# Altium schematic symbol library SignalCommunications.SCHLIB: 804 symbols (part 4 of 9)
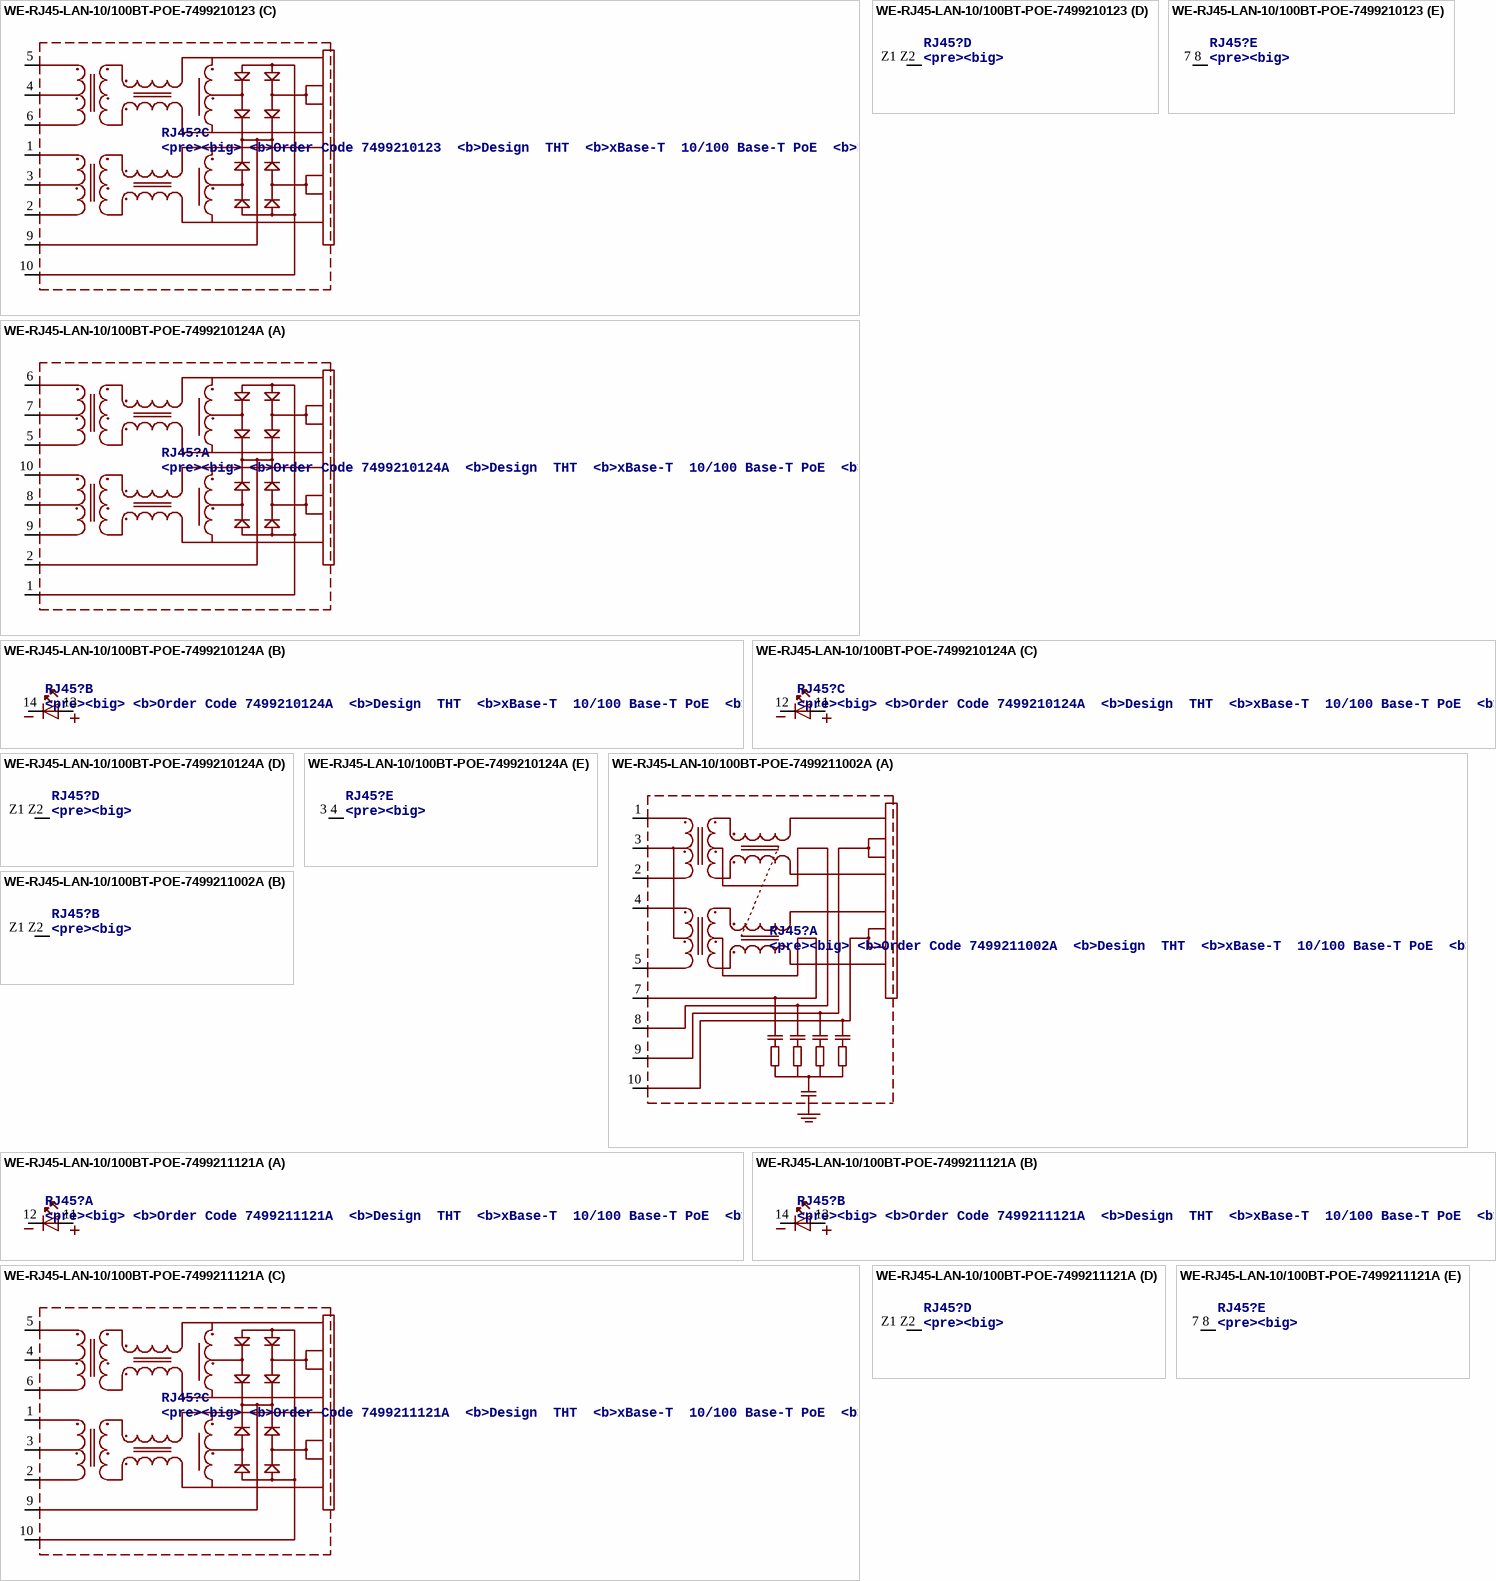
[diagram p45: symbols WE-RJ45-LAN-10/100BT-POE-7499210123 to WE-RJ45-LAN-10/100BT-POE-7499211121A]

## WE-RJ45-LAN-10/100BT-POE-7499210124A
designator RJ45?, comment <pre><big> / <b>Order Code	7499210124A / <b>Design		THT / <b>xBase-T		10/100 Base-T PoE / <b>Ports		1x1 / <b>Application	PoE / <b>Tab Position	UP / <b>LED (Left-Right)	YELLOW-GREEN / <b>EMI Fingers	No
MANUFACTURER: Würth Elektronik eiSos GmbH; CREATED-BY: Christin Zierenner; COMPANY-URL: http://www.we-online.de; CREATED-DATE: AUG 2012; DATASHEET-URL: http://katalog.we-online.de/kataloge/eisos/media/pdf/7499210124A.pdf
footprint 7499210124A
part A pins: 1 VC1- (power), 2 VC1+ (power), 5 RD-, 6 RD+, 7 RCT, 8 TCT, 9 TD-, 10 TD+
part B pins: 13 A, 14 K
part C pins: 11 A, 12 K
part D pins: Z1 Z2 P$1 (power)
part E pins: 3 4 NC

## WE-RJ45-LAN-10/100BT-POE-7499211002A
designator RJ45?, comment <pre><big> / <b>Order Code	7499211002A / <b>Design		THT / <b>xBase-T		10/100 Base-T PoE / <b>Ports		1x1 / <b>Application	PoE / <b>Tab Position	DOWN / <b>LED (Left-Right)	NONE / <b>EMI Fingers	Yes
MANUFACTURER: Würth Elektronik eiSos GmbH; CREATED-BY: Christin Zierenner; COMPANY-URL: http://www.we-online.de; CREATED-DATE: AUG 2012; DATASHEET-URL: http://katalog.we-online.de/kataloge/eisos/media/pdf/7499211002A.pdf
footprint 7499211002A
part A pins: 1 TD+, 2 TD-, 3 TCT, 4 RD+, 5 RD-, 7 VC1+ (power), 8 VC1- (power), 9 VC2+ (power), 10 VC2- (power)
part B pins: Z1 Z2 P$1 (power)

## WE-RJ45-LAN-10/100BT-POE-7499211121A
designator RJ45?, comment <pre><big> / <b>Order Code	7499211121A / <b>Design		THT / <b>xBase-T		10/100 Base-T PoE / <b>Ports		1x1 / <b>Application	PoE / <b>Tab Position	DOWN / <b>LED (Left-Right)	YELLOW-GREEN / <b>EMI Fingers	Yes
MANUFACTURER: Würth Elektronik eiSos GmbH; CREATED-BY: Christin Zierenner; COMPANY-URL: http://www.we-online.de; CREATED-DATE: AUG 2012; DATASHEET-URL: http://katalog.we-online.de/kataloge/eisos/media/pdf/7499211121A.pdf
footprint 7499211121A
part A pins: 11 A, 12 K
part B pins: 13 A, 14 K
part C pins: 1 RD+, 2 RD-, 3 RCT, 4 TCT, 5 TD+, 6 TD-, 9 VC1+ (power), 10 VC1- (power)
part D pins: Z1 Z2 P$1 (power)
part E pins: 7 8 NC

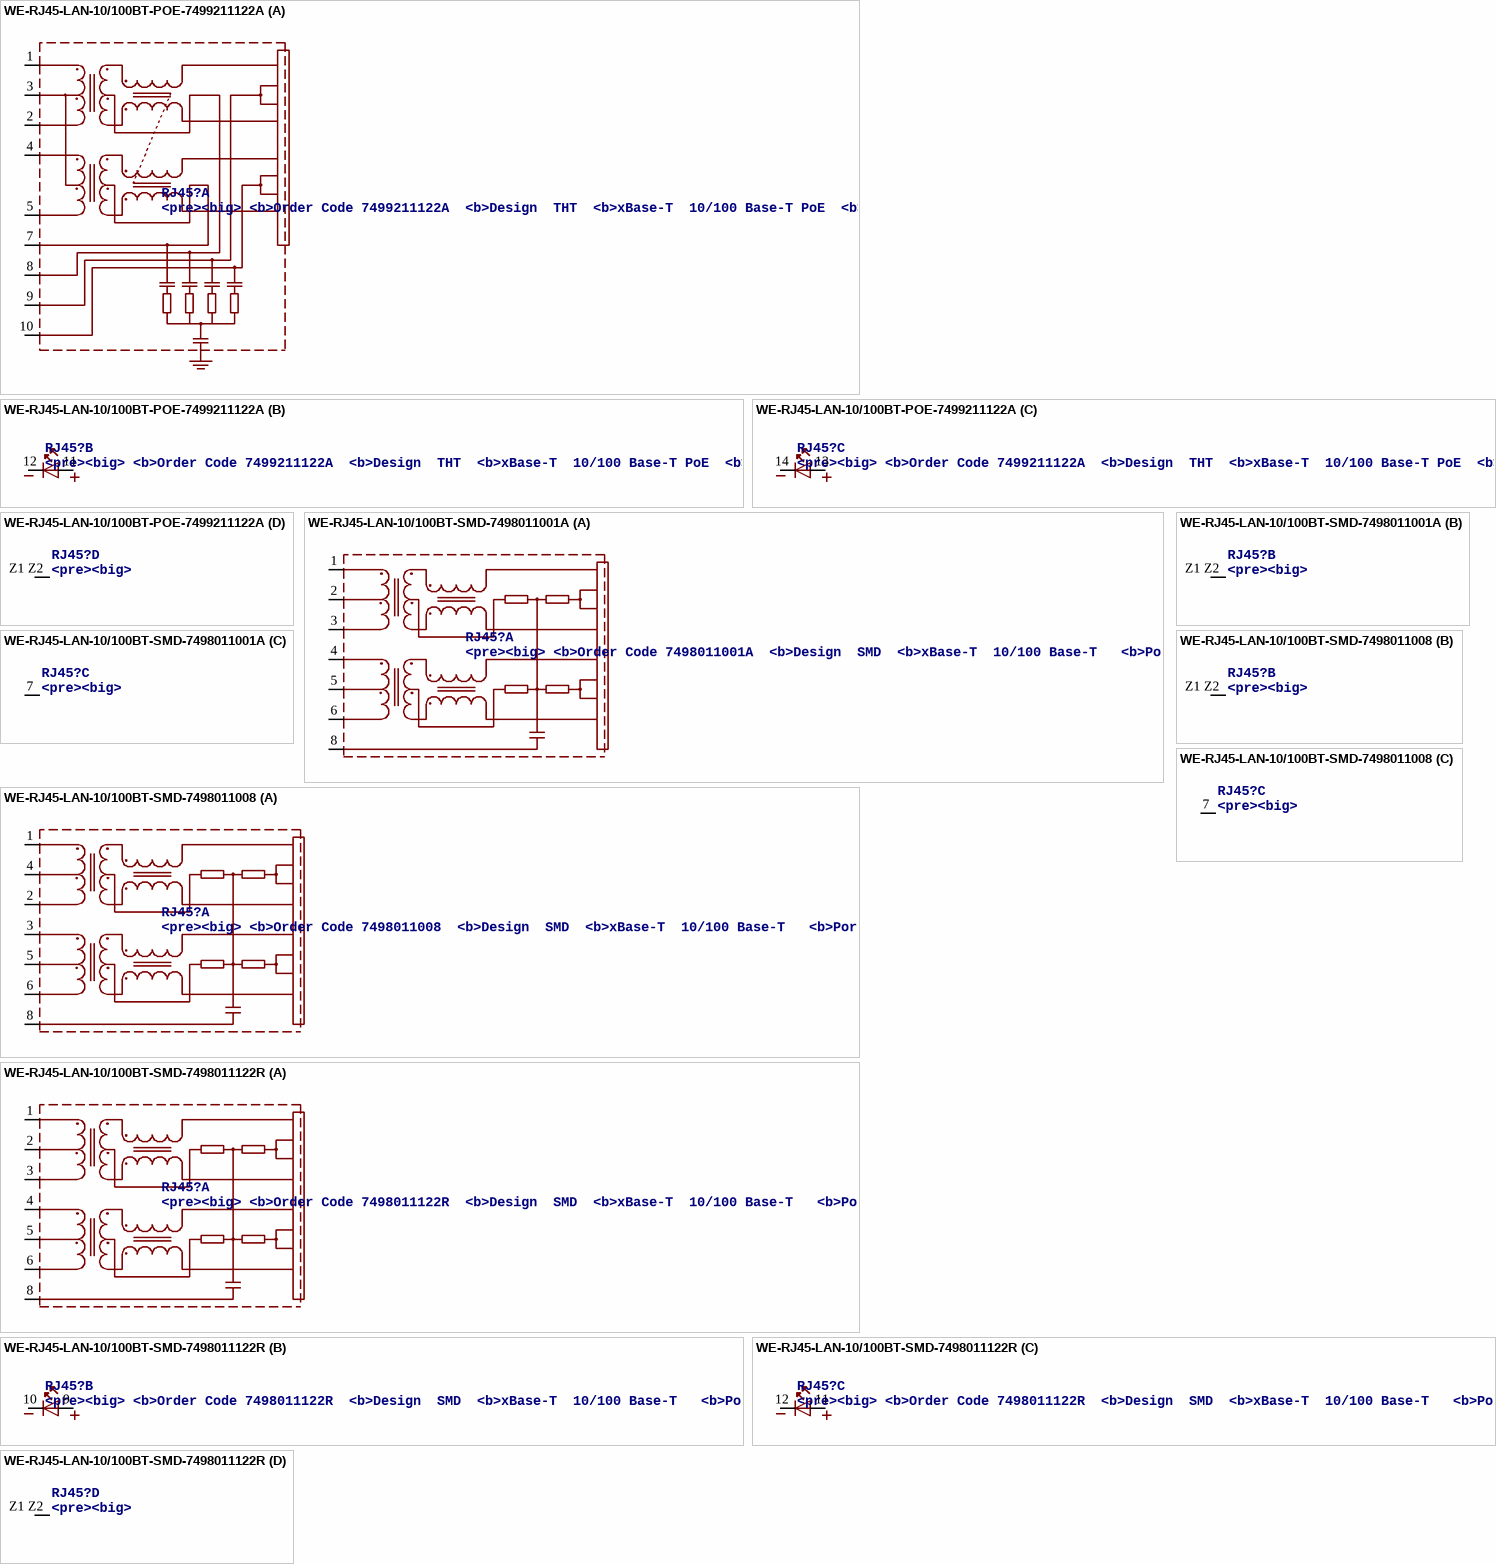
[diagram p26: symbols WE-RJ45-LAN-10/100BT-POE-7499211122A to WE-RJ45-LAN-10/100BT-SMD-7498011122R]

## WE-RJ45-LAN-10/100BT-POE-7499211122A
designator RJ45?, comment <pre><big> / <b>Order Code	7499211122A / <b>Design		THT / <b>xBase-T		10/100 Base-T PoE / <b>Ports		1x1 / <b>Application	PoE / <b>Tab Position	DOWN / <b>LED (Left-Right)	YELLOW-GREEN / <b>EMI Fingers	Yes
MANUFACTURER: Würth Elektronik eiSos GmbH; CREATED-BY: Christin Zierenner; COMPANY-URL: http://www.we-online.de; CREATED-DATE: AUG 2012; DATASHEET-URL: http://katalog.we-online.de/kataloge/eisos/media/pdf/7499211122A.pdf
footprint 7499211122A
part A pins: 1 RD+, 2 RD-, 3 RCT, 4 TD+, 5 TD-, 7 VC1+ (power), 8 VC1- (power), 9 VC2+ (power), 10 VC2- (power)
part B pins: 11 A, 12 K
part C pins: 13 A, 14 K
part D pins: Z1 Z2 P$1 (power)

## WE-RJ45-LAN-10/100BT-SMD-7498011001A
designator RJ45?, comment <pre><big> / <b>Order Code	7498011001A / <b>Design		SMD / <b>xBase-T		10/100 Base-T / <b>Ports		1x1 / <b>Application	Standard / <b>Tab Position	Down / <b>LED (Left-Right)	None / <b>EMI Fingers	Yes
MANUFACTURER: Würth Elektronik eiSos GmbH; CREATED-BY: Christin Zierenner; COMPANY-URL: http://www.we-online.de; CREATED-DATE: AUG 2012; DATASHEET-URL: http://katalog.we-online.de/kataloge/eisos/media/pdf/7498011001A.pdf
footprint 749801100X
part A pins: 1 TD+, 2 TCT, 3 TD-, 4 RD+, 5 RCT, 6 RD-, 8 SH (power)
part B pins: Z1 Z2 P$1 (power)
part C pins: 7 NC

## WE-RJ45-LAN-10/100BT-SMD-7498011008
designator RJ45?, comment <pre><big> / <b>Order Code	7498011008 / <b>Design		SMD / <b>xBase-T		10/100 Base-T / <b>Ports		1x1 / <b>Application	Standard / <b>Tab Position	Down / <b>LED (Left-Right)	None / <b>EMI Fingers	Yes
MANUFACTURER: Würth Elektronik eiSos GmbH; CREATED-BY: Christin Zierenner; COMPANY-URL: http://www.we-online.de; CREATED-DATE: AUG 2012; DATASHEET-URL: http://katalog.we-online.de/kataloge/eisos/media/pdf/7498011008.pdf
footprint 749801100X
part A pins: 1 RD+, 2 RD-, 3 TD+, 4 RCT, 5 TCT, 6 TD-, 8 SH (power)
part B pins: Z1 Z2 P$1 (power)
part C pins: 7 NC

## WE-RJ45-LAN-10/100BT-SMD-7498011122R
designator RJ45?, comment <pre><big> / <b>Order Code	7498011122R / <b>Design		SMD / <b>xBase-T		10/100 Base-T / <b>Ports		1x1 / <b>Application	Standard / <b>Tab Position	Up / <b>LED (Left-Right)	YELLOW-GREEN / <b>EMI Fingers	Yes
MANUFACTURER: Würth Elektronik eiSos GmbH; CREATED-BY: Christin Zierenner; COMPANY-URL: http://www.we-online.de; CREATED-DATE: AUG 2012; DATASHEET-URL: http://katalog.we-online.de/kataloge/eisos/media/pdf/7498011122R.pdf
footprint 7498011122R
part A pins: 1 TD+, 2 TCT, 3 TD-, 4 RD+, 5 RCT, 6 RD-, 8 SH (power)
part B pins: 9 A, 10 K
part C pins: 11 A, 12 K
part D pins: Z1 Z2 P$1 (power)

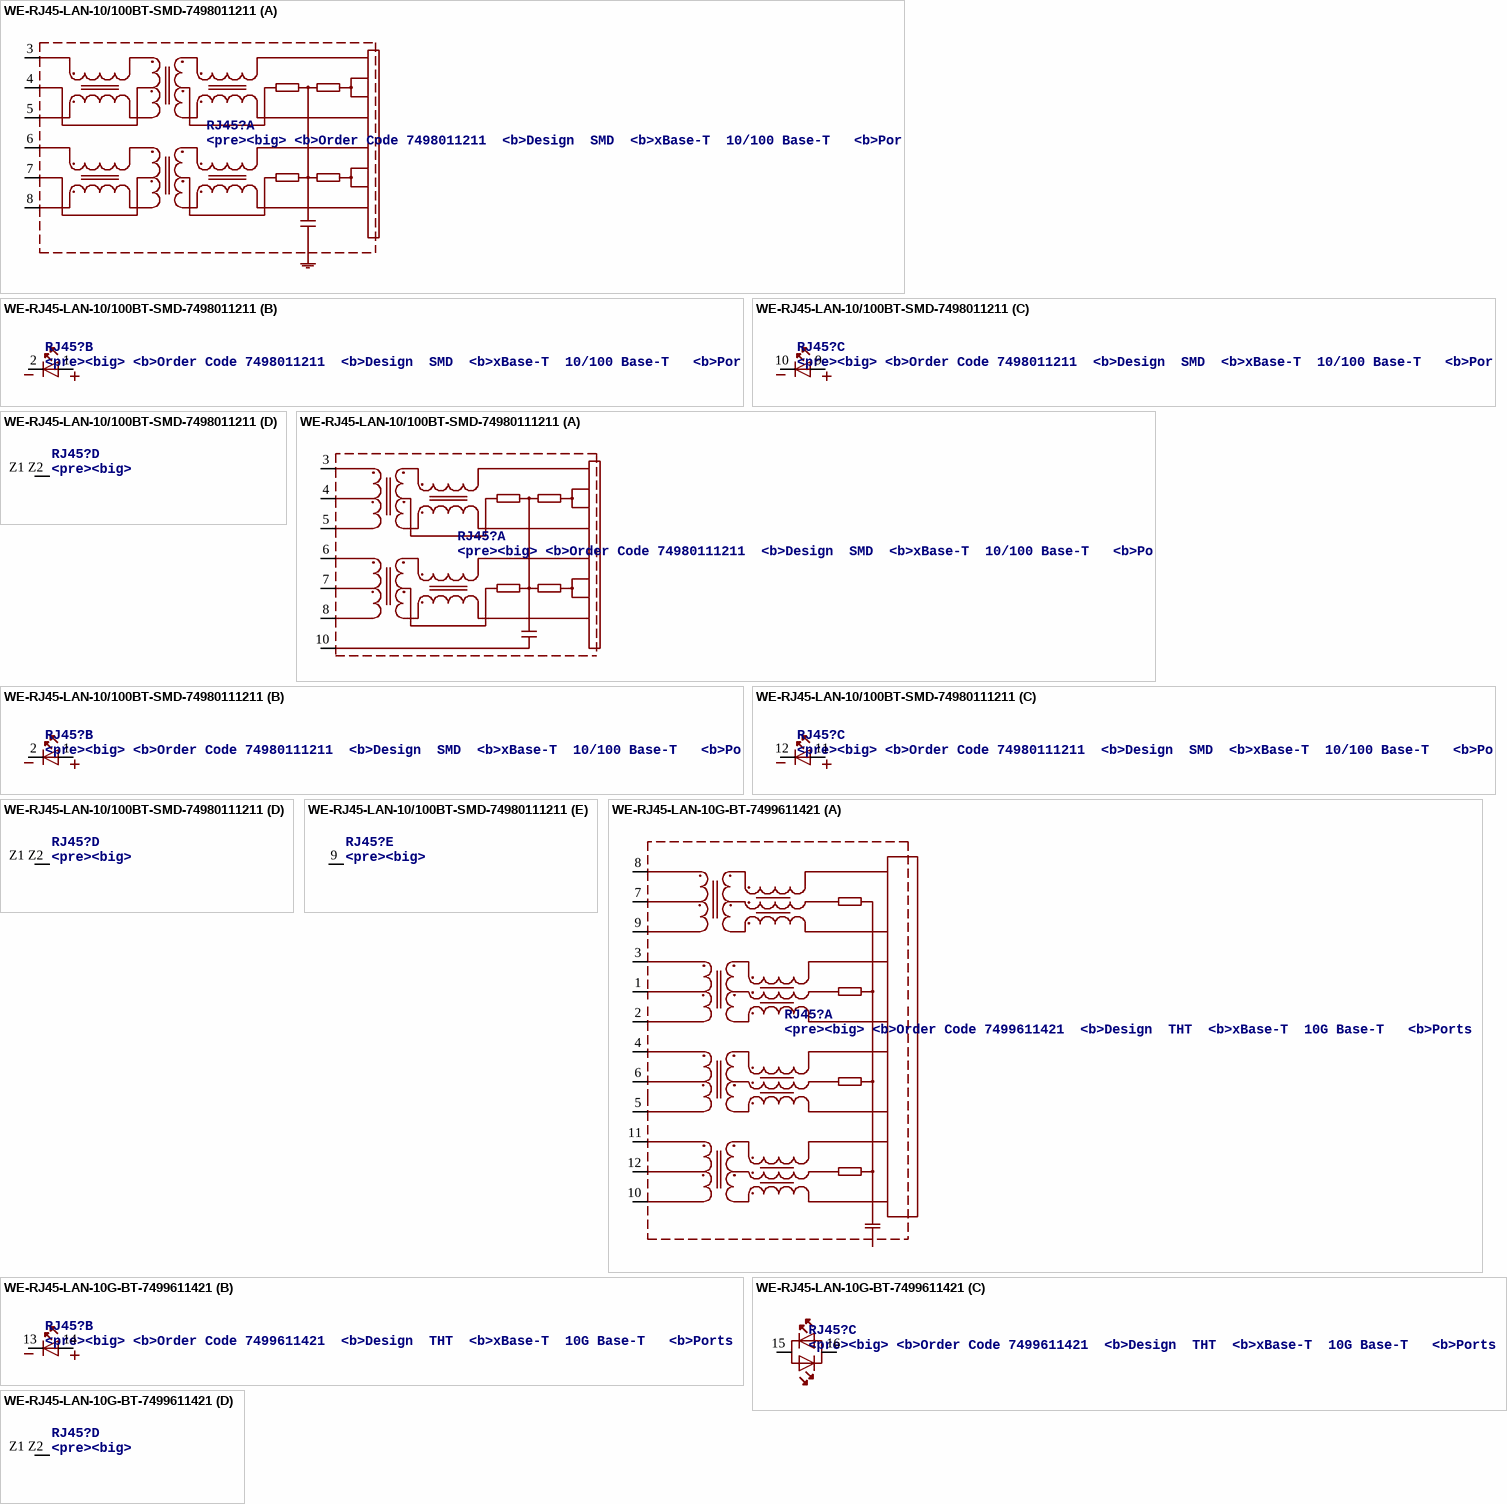
[diagram p27: symbols WE-RJ45-LAN-10/100BT-SMD-7498011211 to WE-RJ45-LAN-10G-BT-7499611421]

## WE-RJ45-LAN-10/100BT-SMD-7498011211
designator RJ45?, comment <pre><big> / <b>Order Code	7498011211 / <b>Design		SMD / <b>xBase-T		10/100 Base-T / <b>Ports		1x1 / <b>Application	Standard / <b>Tab Position	DOWN / <b>LED (Left-Right)	GREEN-YELLOW / <b>EMI Fingers	Yes
MANUFACTURER: Würth Elektronik eiSos GmbH; CREATED-BY: Christin Zierenner; COMPANY-URL: http://www.we-online.de; CREATED-DATE: AUG 2012; DATASHEET-URL: http://katalog.we-online.de/kataloge/eisos/media/pdf/7498011211.pdf
footprint 7498011211
part A pins: 3 TD+, 4 TCT, 5 TD-, 6 RD+, 7 RCT, 8 RD-
part B pins: 1 A, 2 K
part C pins: 9 A, 10 K
part D pins: Z1 Z2 P$1 (power)

## WE-RJ45-LAN-10/100BT-SMD-74980111211
designator RJ45?, comment <pre><big> / <b>Order Code	74980111211 / <b>Design		SMD / <b>xBase-T		10/100 Base-T / <b>Ports		1x1 / <b>Application	Standard / <b>Tab Position	Up / <b>LED (Left-Right)	YELLOW-GREEN / <b>EMI Fingers	Yes
MANUFACTURER: Würth Elektronik eiSos GmbH; CREATED-BY: Christin Zierenner; COMPANY-URL: http://www.we-online.de; CREATED-DATE: AUG 2012; DATASHEET-URL: http://katalog.we-online.de/kataloge/eisos/media/pdf/74980111211.pdf
footprint 74980111211
part A pins: 3 RD+, 4 RCT, 5 RD-, 6 TD+, 7 TCT, 8 TD-, 10 SH (power)
part B pins: 1 A, 2 K
part C pins: 11 A, 12 K
part D pins: Z1 Z2 P$1 (power)
part E pins: 9 NC

## WE-RJ45-LAN-10G-BT-7499611421
designator RJ45?, comment <pre><big> / <b>Order Code	7499611421 / <b>Design		THT / <b>xBase-T		10G Base-T / <b>Ports		1x1 / <b>Application	Standard / <b>Tab Position	UP / <b>LED (Left-Right)	GREEN/YELLOW-GREEN / <b>EMI Fingers	Yes
MANUFACTURER: Würth Elektronik eiSos GmbH; CREATED-BY: Christin Zierenner; COMPANY-URL: http://www.we-online.de; CREATED-DATE: AUG 2012; DATASHEET-URL: http://katalog.we-online.de/kataloge/eisos/media/pdf/7499611421.pdf
footprint 7499611421
part A pins: 1, 2, 3, 4, 5, 6, 7, 8, 9, 10, 11, 12
part B pins: 13 K, 14 A
part C pins: 15 AK1, 16 AK2
part D pins: Z1 Z2 P$1 (power)

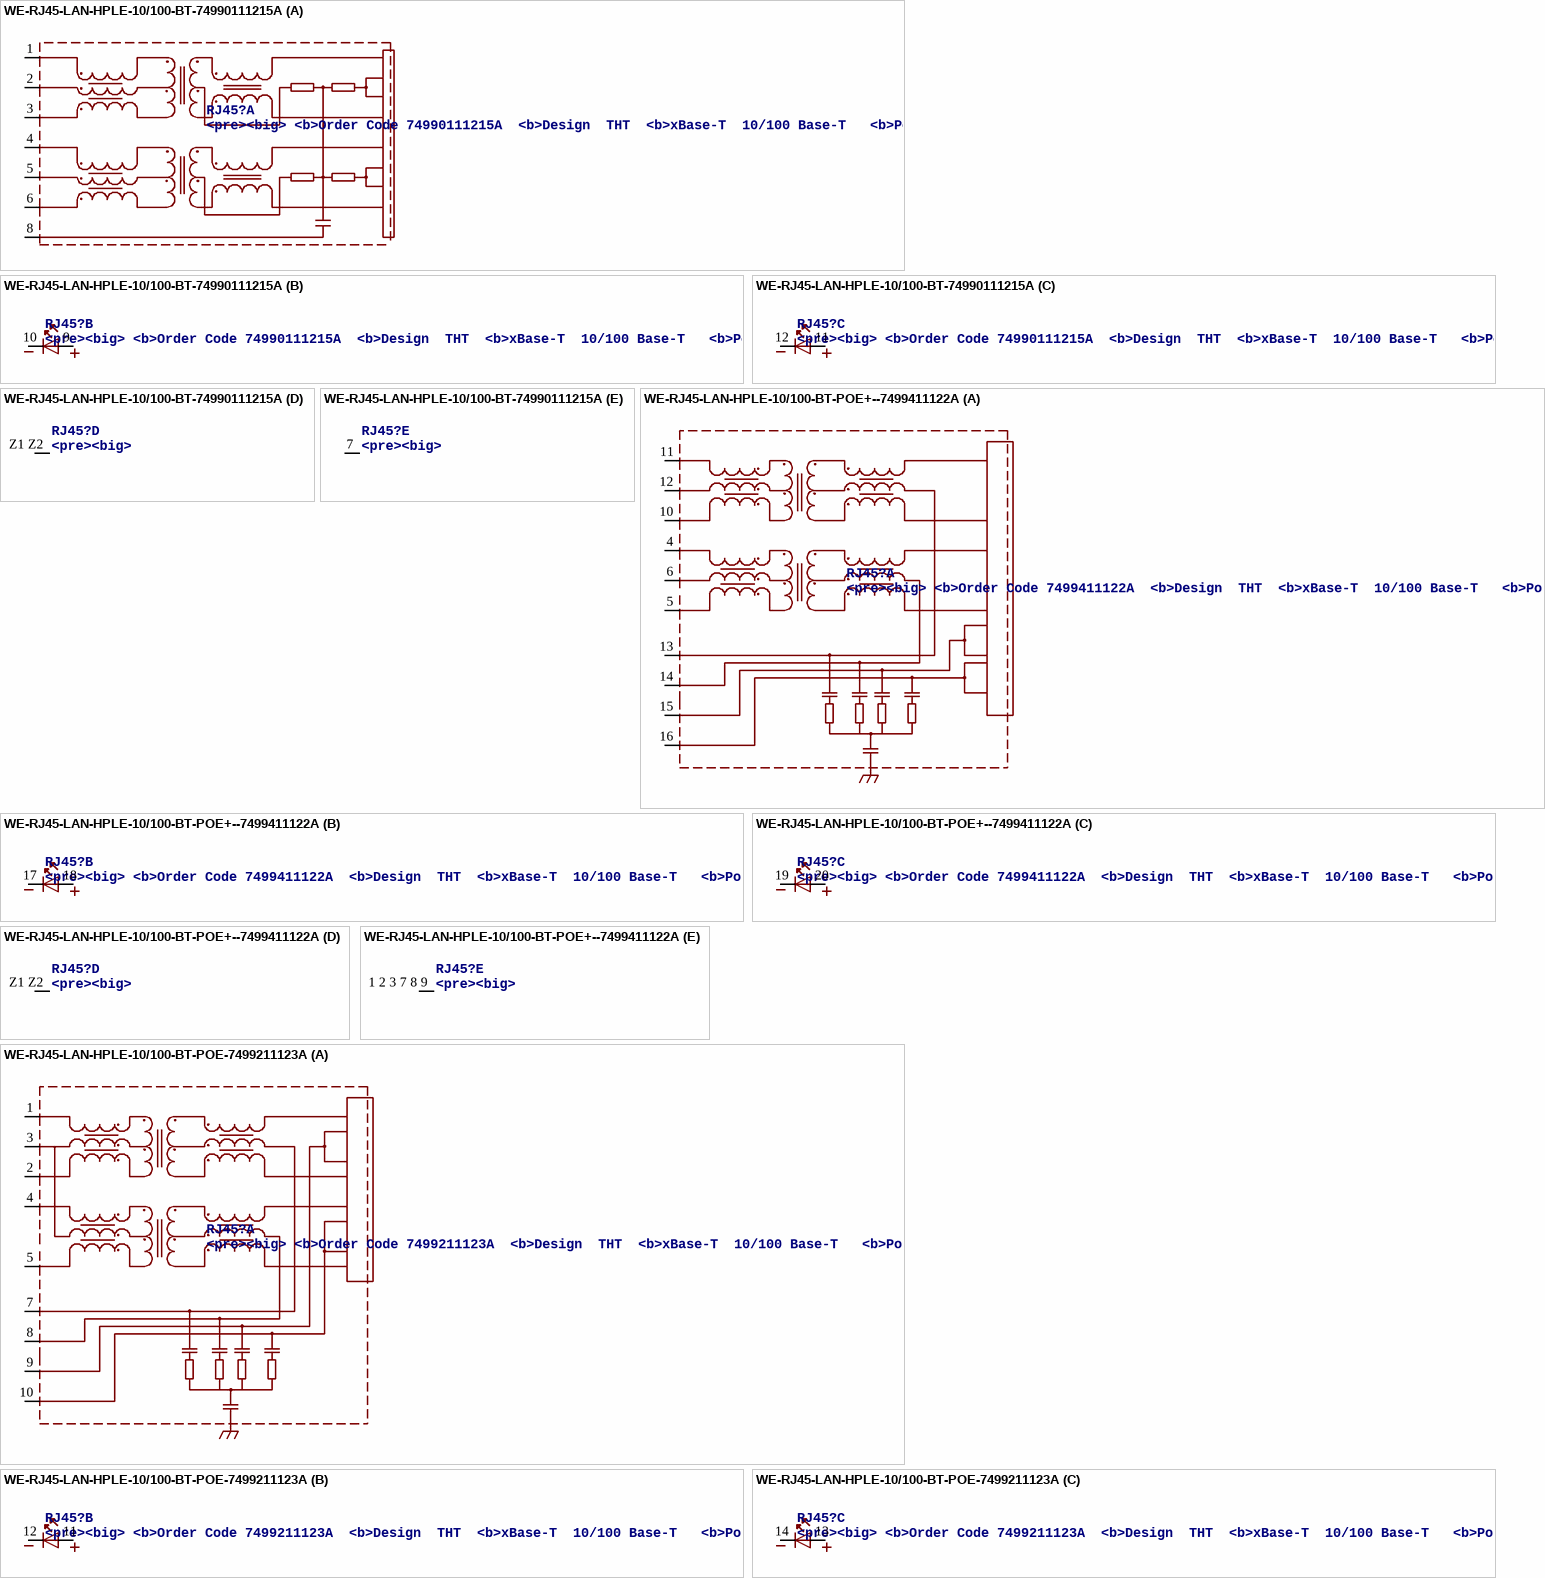
[diagram p28: symbols WE-RJ45-LAN-HPLE-10/100-BT-74990111215A to WE-RJ45-LAN-HPLE-10/100-BT-POE-7499211123A]

## WE-RJ45-LAN-HPLE-10/100-BT-74990111215A
designator RJ45?, comment <pre><big> / <b>Order Code	74990111215A / <b>Design		THT / <b>xBase-T		10/100 Base-T / <b>Ports		1x1 / <b>Application	Standard HPLE / <b>Tab Position	Down / <b>LED (Left-Right)	YELLOW-GREEN / <b>EMI Fingers	YES
MANUFACTURER: Würth Elektronik eiSos GmbH; CREATED-BY: Christin Zierenner; COMPANY-URL: http://www.we-online.de; CREATED-DATE: AUG 2012; DATASHEET-URL: http://katalog.we-online.de/kataloge/eisos/media/pdf/74990111215A.pdf
footprint 74990111215A
part A pins: 1 TD+, 2 TCT, 3 TD-, 4 RD+, 5 RCT, 6 RD-, 8 SH (power)
part B pins: 9 A, 10 K
part C pins: 11 A, 12 K
part D pins: Z1 Z2 P$1 (power)
part E pins: 7 NC

## WE-RJ45-LAN-HPLE-10/100-BT-POE+--7499411122A
designator RJ45?, comment <pre><big> / <b>Order Code	7499411122A / <b>Design		THT / <b>xBase-T		10/100 Base-T / <b>Ports		1x1 / <b>Application	PoE+ HPLE / <b>Tab Position	Up / <b>LED (Left-Right)	YELLOW-GREEN / <b>EMI Fingers	YES
MANUFACTURER: Würth Elektronik eiSos GmbH; CREATED-BY: Christin Zierenner; COMPANY-URL: http://www.we-online.de; CREATED-DATE: AUG 2012; DATASHEET-URL: http://katalog.we-online.de/kataloge/eisos/media/pdf/7499411122A.pdf
footprint 7499411122A
part A pins: 4, 5, 6, 10, 11, 12, 13 VC1+ (power), 14 VC1- (power), 15 VC2+ (power), 16 VC2- (power)
part B pins: 17 K, 18 A
part C pins: 19 K, 20 A
part D pins: Z1 Z2 P$1 (power)
part E pins: 1 2 3 7 8 9 NC

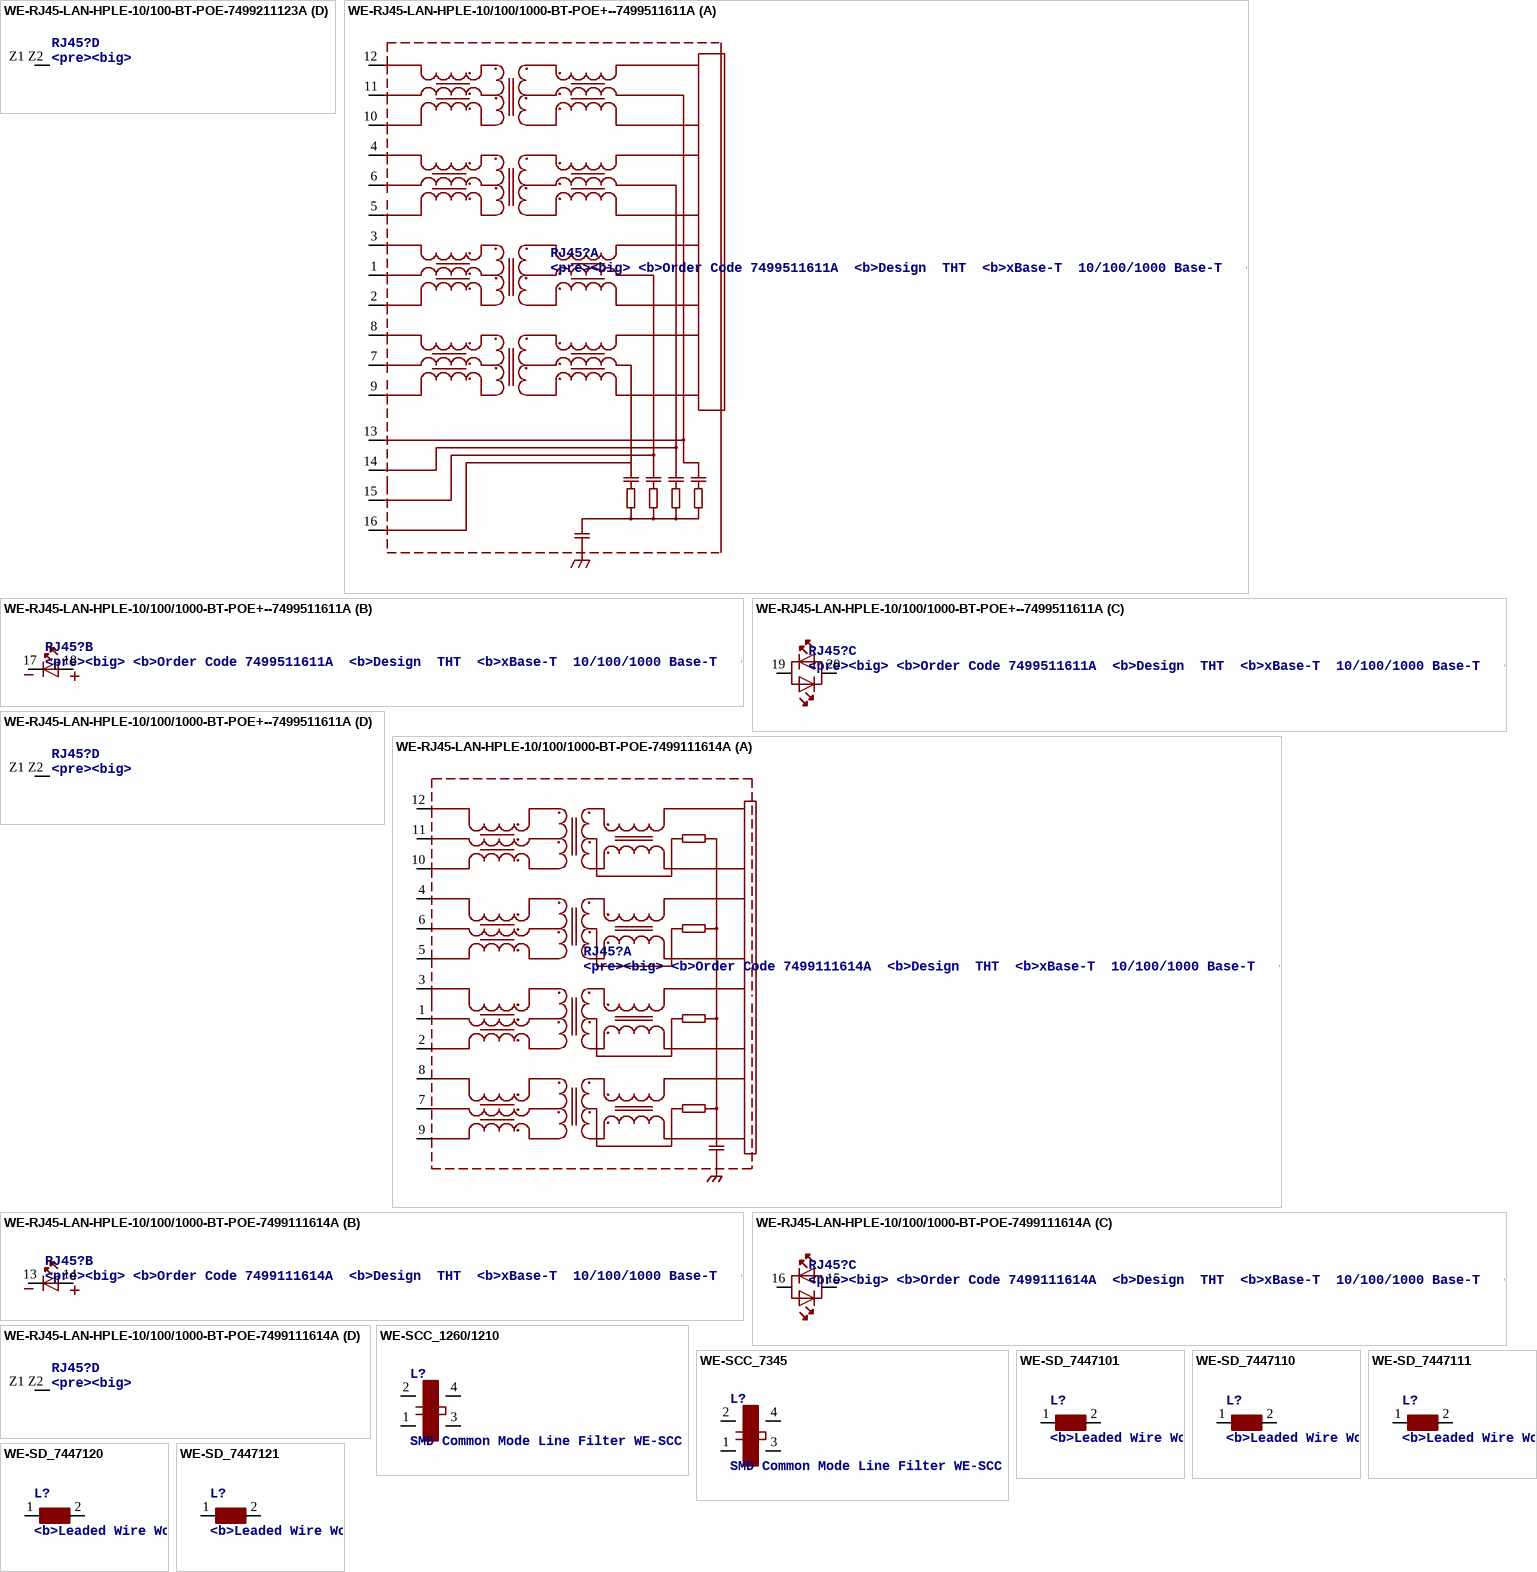
[diagram p29: symbols WE-RJ45-LAN-HPLE-10/100-BT-POE-7499211123A to WE-SD_7447121]

## WE-RJ45-LAN-HPLE-10/100-BT-POE-7499211123A
designator RJ45?, comment <pre><big> / <b>Order Code	7499211123A / <b>Design		THT / <b>xBase-T		10/100 Base-T / <b>Ports		1x1 / <b>Application	PoE HPLE / <b>Tab Position	Down / <b>LED (Left-Right)	YELLOW-GREEN / <b>EMI Fingers	YES
MANUFACTURER: Würth Elektronik eiSos GmbH; CREATED-BY: Christin Zierenner; COMPANY-URL: http://www.we-online.de; CREATED-DATE: AUG 2012; DATASHEET-URL: http://katalog.we-online.de/pbs/datasheet/7499211123A.pdf
footprint 7499211123A
part A pins: 1, 2, 3, 4, 5, 7 VC1+ (power), 8 VC1- (power), 9 VC2+ (power), 10 VC2- (power)
part B pins: 11 A, 12 K
part C pins: 13 A, 14 K
part D pins: Z1 Z2 P$1 (power)

## WE-RJ45-LAN-HPLE-10/100/1000-BT-POE+--7499511611A
designator RJ45?, comment <pre><big> / <b>Order Code	7499511611A / <b>Design		THT / <b>xBase-T		10/100/1000 Base-T / <b>Ports		1x1 / <b>Application	PoE+ HPLE / <b>Tab Position	Up / <b>LED (Left-Right)	GREEN/ORANGE-YELLOW / <b>EMI Fingers	YES
MANUFACTURER: Würth Elektronik eiSos GmbH; CREATED-BY: Christin Zierenner; COMPANY-URL: http://www.we-online.de; CREATED-DATE: AUG 2012; DATASHEET-URL: http://katalog.we-online.de/kataloge/eisos/media/pdf/7499511611A.pdf
footprint 7499511611A
part A pins: 1, 2, 3, 4, 5, 6, 7, 8, 9, 10, 11, 12, 13 VC1+ (power), 14 VC1- (power), 15 VC2+ (power), 16 VC2- (power)
part B pins: 17 K, 18 A
part C pins: 19 AK1, 20 AK2
part D pins: Z1 Z2 P$1 (power)

## WE-RJ45-LAN-HPLE-10/100/1000-BT-POE-7499111614A
designator RJ45?, comment <pre><big> / <b>Order Code	7499111614A / <b>Design		THT / <b>xBase-T		10/100/1000 Base-T / <b>Ports		1x1 / <b>Application	Standard HPLE / <b>Tab Position	Up / <b>LED (Left-Right)	GREEN/ORANGE-YELLOW / <b>EMI Fingers	YES
MANUFACTURER: Würth Elektronik eiSos GmbH; CREATED-BY: Christin Zierenner; COMPANY-URL: http://www.we-online.de; CREATED-DATE: AUG 2012; DATASHEET-URL: http://katalog.we-online.de/kataloge/eisos/media/pdf/7499111614A.pdf
footprint 7499111614A
part A pins: 1, 2, 3, 4, 5, 6, 7, 8, 9, 10, 11, 12
part B pins: 13 K, 14 A
part C pins: 15 AK2, 16 AK1
part D pins: Z1 Z2 P$1 (power)

## WE-SCC_1260/1210
designator L?, comment SMD Common Mode Line Filter WE-SCC
footprint WE-SCC_1260/1210
pins: 1, 2 3, 3 2, 4

## WE-SCC_7345
designator L?, comment SMD Common Mode Line Filter WE-SCC
footprint WE-SCC_7345
pins: 1, 2 3, 3 2, 4

## WE-SD_7447101
designator L?, comment <b>Leaded Wire Wound Rodcore Inductor WE-SD HIGH CURRENT</b><p> / - Rated Current up to 20 A<br> / - Inductance is independent from rated DC current<br> / - Mechanical dimensions can be adjusted on customer request<br> / - High mechanical stability<p> / -- Swirching regulators<br> / -- Motors<br> / -- Power amplifiers<br> / -- Power supplies<br> / -- Especially designed for automotive industry<br> / -- Broadband filtering
footprint WE-SD_7447101
pins: 1, 2

## WE-SD_7447110
designator L?, comment <b>Leaded Wire Wound Rodcore Inductor WE-SD HIGH CURRENT</b><p> / - Rated Current up to 20 A<br> / - Inductance is independent from rated DC current<br> / - Mechanical dimensions can be adjusted on customer request<br> / - High mechanical stability<p> / -- Swirching regulators<br> / -- Motors<br> / -- Power amplifiers<br> / -- Power supplies<br> / -- Especially designed for automotive industry<br> / -- Broadband filtering
footprint WE-SD_7447110
pins: 1, 2

## WE-SD_7447111
designator L?, comment <b>Leaded Wire Wound Rodcore Inductor WE-SD HIGH CURRENT</b><p> / - Rated Current up to 20 A<br> / - Inductance is independent from rated DC current<br> / - Mechanical dimensions can be adjusted on customer request<br> / - High mechanical stability<p> / -- Swirching regulators<br> / -- Motors<br> / -- Power amplifiers<br> / -- Power supplies<br> / -- Especially designed for automotive industry<br> / -- Broadband filtering
footprint WE-SD_7447111
pins: 1, 2

## WE-SD_7447120
designator L?, comment <b>Leaded Wire Wound Rodcore Inductor WE-SD HIGH CURRENT</b><p> / - Rated Current up to 20 A<br> / - Inductance is independent from rated DC current<br> / - Mechanical dimensions can be adjusted on customer request<br> / - High mechanical stability<p> / -- Swirching regulators<br> / -- Motors<br> / -- Power amplifiers<br> / -- Power supplies<br> / -- Especially designed for automotive industry<br> / -- Broadband filtering
footprint WE-SD_7447120
pins: 1, 2

## WE-SD_7447121
designator L?, comment <b>Leaded Wire Wound Rodcore Inductor WE-SD HIGH CURRENT</b><p> / - Rated Current up to 20 A<br> / - Inductance is independent from rated DC current<br> / - Mechanical dimensions can be adjusted on customer request<br> / - High mechanical stability<p> / -- Swirching regulators<br> / -- Motors<br> / -- Power amplifiers<br> / -- Power supplies<br> / -- Especially designed for automotive industry<br> / -- Broadband filtering
footprint WE-SD_7447121
pins: 1, 2

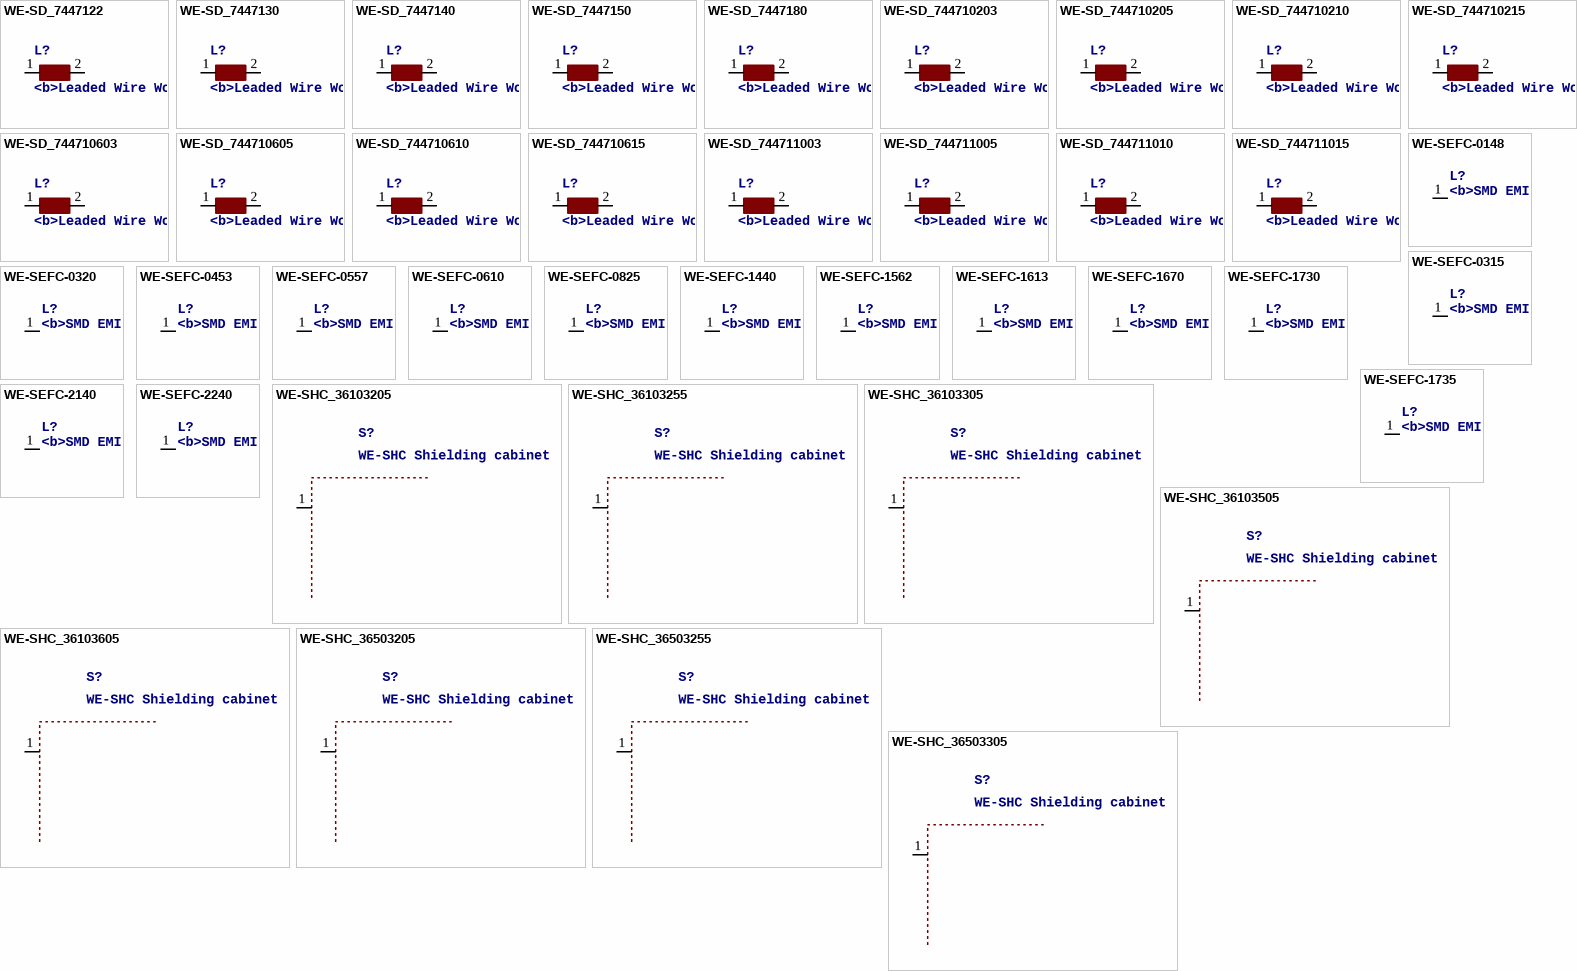
[diagram p30: symbols WE-SD_7447122 to WE-SHC_36503305]

## WE-SD_7447122
designator L?, comment <b>Leaded Wire Wound Rodcore Inductor WE-SD HIGH CURRENT</b><p> / - Rated Current up to 20 A<br> / - Inductance is independent from rated DC current<br> / - Mechanical dimensions can be adjusted on customer request<br> / - High mechanical stability<p> / -- Swirching regulators<br> / -- Motors<br> / -- Power amplifiers<br> / -- Power supplies<br> / -- Especially designed for automotive industry<br> / -- Broadband filtering
footprint WE-SD_7447122
pins: 1, 2

## WE-SD_7447130
designator L?, comment <b>Leaded Wire Wound Rodcore Inductor WE-SD HIGH CURRENT</b><p> / - Rated Current up to 20 A<br> / - Inductance is independent from rated DC current<br> / - Mechanical dimensions can be adjusted on customer request<br> / - High mechanical stability<p> / -- Swirching regulators<br> / -- Motors<br> / -- Power amplifiers<br> / -- Power supplies<br> / -- Especially designed for automotive industry<br> / -- Broadband filtering
footprint WE-SD_7447130
pins: 1, 2

## WE-SD_7447140
designator L?, comment <b>Leaded Wire Wound Rodcore Inductor WE-SD HIGH CURRENT</b><p> / - Rated Current up to 20 A<br> / - Inductance is independent from rated DC current<br> / - Mechanical dimensions can be adjusted on customer request<br> / - High mechanical stability<p> / -- Swirching regulators<br> / -- Motors<br> / -- Power amplifiers<br> / -- Power supplies<br> / -- Especially designed for automotive industry<br> / -- Broadband filtering
footprint WE-SD_7447140
pins: 1, 2
